# Altium schematic symbol library ON Semi Transient Voltage Suppressors (TVS).SchLib: 730 symbols (part 3 of 5) (continued)
## MMBZ33VALT1G
designator D?
40 W Peak Power Zener Transient Voltage Suppressor, Dual Common Anode Zeners for ESD Protection, 3-Pin SOT-23, Pb-Free, Tape and Reel; Manufacturer: On Semiconductor; PartNumber: MMBZ33VALT1G; Direction: Unidirectional; IR Max (uA): 0.05; PPK Max (W): 40; V(BR) Typ (V): 33; DatasheetVersion: Rev. 13; PackageVersion: Rev. AP, 11/2009; PackageReference: SOT-23-3-318-08; PackageDescription: 3-Pin Small Outline Transistor, Body 2.92 x 1.3 mm, Pitch 0.95 mm; Supplier 1: Digi-Key; Supplier Part Number 1: MMBZ33VALT1GOSTR-ND; Supplier 2: Digi-Key; Supplier Part Number 2: MMBZ33VALT1GOSCT-ND; Supplier 3: Digi-Key; Supplier Part Number 3: MMBZ33VALT1GOSDKR-ND; Supplier 4: Farnell; Supplier Part Number 4: 1431231; Supplier 5: Farnell; Supplier Part Number 5: 1431231RL; Supplier 6: Farnell; Supplier Part Number 6: 2317785; Supplier 7: Newark; Supplier Part Number 7: 85W2815; Supplier 8: Newark; Supplier Part Number 8: 98H0767; Supplier 9: Mouser; Supplier Part Number 9: 863-MMBZ33VALT1G; Packing: Tape and Reel; RoHS: Pb-Free; Mounting Technology: Surface Mount; ComponentLink1Description: Manufacturer URL; ComponentLink1URL: http://www.onsemi.com/; ComponentLink2Description: Datasheet; ComponentLink2URL: http://www.onsemi.com/pub_link/Collateral/MMBZ5V6ALT1-D.PDF; ComponentLink3Description: Package Specification; ComponentLink3URL: http://www.onsemi.cn/pub_link/Collateral/318-08.PDF
footprint ONSC-SOT-23-3-318-08_V (SOT23, 3-Leads, Body 2.92x1.3mm, Pitch 0.95mm)
pins: 1 K1, 2 K2, 3 A

## MMQA5V6T1G
designator U?
Quad Monolithic Common Anode, Transient Voltage Suppressor for ESD Protection, 6-Pin SC-74, Pb-Free, Tape and Reel; Manufacturer: On Semiconductor; PartNumber: MMQA5V6T1G; Direction: Unidirectional; IR Max (uA): 2; V(BR) Typ (V): 5.6; DatasheetVersion: Rev. 10; PackageVersion: Rev. N, 06/2012; PackageReference: SC-74-6-318F-05; PackageDescription: 6-Pin Small Outline Transistor, Body 3 x 1.5 mm, Pitch 0.95 mm; Supplier 1: Digi-Key; Supplier Part Number 1: MMQA5V6T1GOSTR-ND; Supplier 2: Digi-Key; Supplier Part Number 2: MMQA5V6T1GOSCT-ND; Supplier 3: Digi-Key; Supplier Part Number 3: MMQA5V6T1GOSDKR-ND; Supplier 4: Farnell; Supplier Part Number 4: 1459113RL; Supplier 5: Newark; Supplier Part Number 5: 98H0804; Supplier 6: Mouser; Supplier Part Number 6: 863-MMQA5V6T1G; Packing: Tape and Reel; RoHS: Pb-Free; Mounting Technology: Surface Mount; ComponentLink1Description: Manufacturer URL; ComponentLink1URL: http://www.onsemi.com/; ComponentLink2Description: Datasheet; ComponentLink2URL: http://www.onsemi.com/pub_link/Collateral/MMQA-D.PDF; ComponentLink3Description: Package Specification; ComponentLink3URL: http://www.onsemi.com/pub_link/Collateral/318F-05.PDF
footprint ONSC-SC-74-6-318F-05_V (SOT23, 6-Leads, Body 3x1.5mm, Pitch 0.95mm)
pins: 1 K1, 2 A1, 3 K2, 4 K3, 5 A2, 6 K4

## MMQA5V6T3G
designator U?
Quad Monolithic Common Anode, Transient Voltage Suppressor for ESD Protection, 6-Pin SC-74, Pb-Free, Tape and Reel; Manufacturer: On Semiconductor; PartNumber: MMQA5V6T3G; Direction: Unidirectional; IR Max (uA): 2; V(BR) Typ (V): 5.6; DatasheetVersion: Rev. 10; PackageVersion: Rev. N, 06/2012; PackageReference: SC-74-6-318F-05; PackageDescription: 6-Pin Small Outline Transistor, Body 3 x 1.5 mm, Pitch 0.95 mm; Supplier 1: Digi-Key; Supplier Part Number 1: MMQA5V6T3G-ND; Supplier 2: Mouser; Supplier Part Number 2: 863-MMQA5V6T3G; Packing: Tape and Reel; RoHS: Pb-Free; Mounting Technology: Surface Mount; ComponentLink1Description: Manufacturer URL; ComponentLink1URL: http://www.onsemi.com/; ComponentLink2Description: Datasheet; ComponentLink2URL: http://www.onsemi.com/pub_link/Collateral/MMQA-D.PDF; ComponentLink3Description: Package Specification; ComponentLink3URL: http://www.onsemi.com/pub_link/Collateral/318F-05.PDF
footprint ONSC-SC-74-6-318F-05_V (SOT23, 6-Leads, Body 3x1.5mm, Pitch 0.95mm)
pins: 1 K1, 2 A1, 3 K2, 4 K3, 5 A2, 6 K4

## MMQA6V2T1G
designator U?
Quad Monolithic Common Anode, Transient Voltage Suppressor for ESD Protection, 6-Pin SC-74, Pb-Free, Tape and Reel; Manufacturer: On Semiconductor; PartNumber: MMQA6V2T1G; Direction: Unidirectional; IR Max (uA): 0.7; V(BR) Typ (V): 6.2; DatasheetVersion: Rev. 10; PackageVersion: Rev. N, 06/2012; PackageReference: SC-74-6-318F-05; PackageDescription: 6-Pin Small Outline Transistor, Body 3 x 1.5 mm, Pitch 0.95 mm; Supplier 1: Digi-Key; Supplier Part Number 1: MMQA6V2T1GOSTR-ND; Supplier 2: Digi-Key; Supplier Part Number 2: MMQA6V2T1GOSCT-ND; Supplier 3: Digi-Key; Supplier Part Number 3: MMQA6V2T1GOSDKR-ND; Supplier 4: Newark; Supplier Part Number 4: 45J1567; Supplier 5: Mouser; Supplier Part Number 5: 863-MMQA6V2T1G; Packing: Tape and Reel; RoHS: Pb-Free; Mounting Technology: Surface Mount; ComponentLink1Description: Manufacturer URL; ComponentLink1URL: http://www.onsemi.com/; ComponentLink2Description: Datasheet; ComponentLink2URL: http://www.onsemi.com/pub_link/Collateral/MMQA-D.PDF; ComponentLink3Description: Package Specification; ComponentLink3URL: http://www.onsemi.com/pub_link/Collateral/318F-05.PDF
footprint ONSC-SC-74-6-318F-05_V (SOT23, 6-Leads, Body 3x1.5mm, Pitch 0.95mm)
pins: 1 K1, 2 A1, 3 K2, 4 K3, 5 A2, 6 K4

## MMQA6V2T3G
designator U?
Quad Monolithic Common Anode, Transient Voltage Suppressor for ESD Protection, 6-Pin SC-74, Pb-Free, Tape and Reel; Manufacturer: On Semiconductor; PartNumber: MMQA6V2T3G; Direction: Unidirectional; IR Max (uA): 0.7; V(BR) Typ (V): 6.2; DatasheetVersion: Rev. 10; PackageVersion: Rev. N, 06/2012; PackageReference: SC-74-6-318F-05; PackageDescription: 6-Pin Small Outline Transistor, Body 3 x 1.5 mm, Pitch 0.95 mm; Supplier 1: Digi-Key; Supplier Part Number 1: MMQA6V2T3G-ND; Supplier 2: Mouser; Supplier Part Number 2: 863-MMQA6V2T3G; Packing: Tape and Reel; RoHS: Pb-Free; Mounting Technology: Surface Mount; ComponentLink1Description: Manufacturer URL; ComponentLink1URL: http://www.onsemi.com/; ComponentLink2Description: Datasheet; ComponentLink2URL: http://www.onsemi.com/pub_link/Collateral/MMQA-D.PDF; ComponentLink3Description: Package Specification; ComponentLink3URL: http://www.onsemi.com/pub_link/Collateral/318F-05.PDF
footprint ONSC-SC-74-6-318F-05_V (SOT23, 6-Leads, Body 3x1.5mm, Pitch 0.95mm)
pins: 1 K1, 2 A1, 3 K2, 4 K3, 5 A2, 6 K4

## MMQA6V8T1G
designator U?
Quad Monolithic Common Anode, Transient Voltage Suppressor for ESD Protection, 6-Pin SC-74, Pb-Free, Tape and Reel; Manufacturer: On Semiconductor; PartNumber: MMQA6V8T1G; Direction: Unidirectional; IR Max (uA): 0.5; V(BR) Typ (V): 6.8; DatasheetVersion: Rev. 10; PackageVersion: Rev. N, 06/2012; PackageReference: SC-74-6-318F-05; PackageDescription: 6-Pin Small Outline Transistor, Body 3 x 1.5 mm, Pitch 0.95 mm; Supplier 1: Digi-Key; Supplier Part Number 1: MMQA6V8T1GOSTR-ND; Supplier 2: Digi-Key; Supplier Part Number 2: MMQA6V8T1GOSCT-ND; Supplier 3: Digi-Key; Supplier Part Number 3: MMQA6V8T1GOSDKR-ND; Supplier 4: Mouser; Supplier Part Number 4: 863-MMQA6V8T1G; Packing: Tape and Reel; RoHS: Pb-Free; Mounting Technology: Surface Mount; ComponentLink1Description: Manufacturer URL; ComponentLink1URL: http://www.onsemi.com/; ComponentLink2Description: Datasheet; ComponentLink2URL: http://www.onsemi.com/pub_link/Collateral/MMQA-D.PDF; ComponentLink3Description: Package Specification; ComponentLink3URL: http://www.onsemi.com/pub_link/Collateral/318F-05.PDF
footprint ONSC-SC-74-6-318F-05_V (SOT23, 6-Leads, Body 3x1.5mm, Pitch 0.95mm)
pins: 1 K1, 2 A1, 3 K2, 4 K3, 5 A2, 6 K4

## MMQA12VT1G
designator U?
Quad Monolithic Common Anode, Transient Voltage Suppressor for ESD Protection, 6-Pin SC-74, Pb-Free, Tape and Reel; Manufacturer: On Semiconductor; PartNumber: MMQA12VT1G; Direction: Unidirectional; IR Max (uA): 0.075; V(BR) Typ (V): 12; DatasheetVersion: Rev. 10; PackageVersion: Rev. N, 06/2012; PackageReference: SC-74-6-318F-05; PackageDescription: 6-Pin Small Outline Transistor, Body 3 x 1.5 mm, Pitch 0.95 mm; Supplier 1: Digi-Key; Supplier Part Number 1: MMQA12VT1GOSTR-ND; Supplier 2: Digi-Key; Supplier Part Number 2: MMQA12VT1GOSCT-ND; Supplier 3: Digi-Key; Supplier Part Number 3: MMQA12VT1GOSDKR-ND; Supplier 4: Farnell; Supplier Part Number 4: 1899523; Supplier 5: Newark; Supplier Part Number 5: 09R9473; Supplier 6: Mouser; Supplier Part Number 6: 863-MMQA12VT1G; Packing: Tape and Reel; RoHS: Pb-Free; Mounting Technology: Surface Mount; ComponentLink1Description: Manufacturer URL; ComponentLink1URL: http://www.onsemi.com/; ComponentLink2Description: Datasheet; ComponentLink2URL: http://www.onsemi.com/pub_link/Collateral/MMQA-D.PDF; ComponentLink3Description: Package Specification; ComponentLink3URL: http://www.onsemi.com/pub_link/Collateral/318F-05.PDF
footprint ONSC-SC-74-6-318F-05_V (SOT23, 6-Leads, Body 3x1.5mm, Pitch 0.95mm)
pins: 1 K1, 2 A1, 3 K2, 4 K3, 5 A2, 6 K4

## MMQA15VT1G
designator U?
Quad Monolithic Common Anode, Transient Voltage Suppressor for ESD Protection, 6-Pin SC-74, Pb-Free, Tape and Reel; Manufacturer: On Semiconductor; PartNumber: MMQA15VT1G; Direction: Unidirectional; IR Max (uA): 0.075; V(BR) Typ (V): 15; DatasheetVersion: Rev. 10; PackageVersion: Rev. N, 06/2012; PackageReference: SC-74-6-318F-05; PackageDescription: 6-Pin Small Outline Transistor, Body 3 x 1.5 mm, Pitch 0.95 mm; Supplier 1: Digi-Key; Supplier Part Number 1: MMQA15VT1G-ND; Supplier 2: Mouser; Supplier Part Number 2: 863-MMQA15VT1G; Packing: Tape and Reel; RoHS: Pb-Free; Mounting Technology: Surface Mount; ComponentLink1Description: Manufacturer URL; ComponentLink1URL: http://www.onsemi.com/; ComponentLink2Description: Datasheet; ComponentLink2URL: http://www.onsemi.com/pub_link/Collateral/MMQA-D.PDF; ComponentLink3Description: Package Specification; ComponentLink3URL: http://www.onsemi.com/pub_link/Collateral/318F-05.PDF
footprint ONSC-SC-74-6-318F-05_V (SOT23, 6-Leads, Body 3x1.5mm, Pitch 0.95mm)
pins: 1 K1, 2 A1, 3 K2, 4 K3, 5 A2, 6 K4

## MMQA18VT1G
designator U?
Quad Monolithic Common Anode, Transient Voltage Suppressor for ESD Protection, 6-Pin SC-74, Pb-Free, Tape and Reel; Manufacturer: On Semiconductor; PartNumber: MMQA18VT1G; Direction: Unidirectional; IR Max (uA): 0.075; V(BR) Typ (V): 18; DatasheetVersion: Rev. 10; PackageVersion: Rev. N, 06/2012; PackageReference: SC-74-6-318F-05; PackageDescription: 6-Pin Small Outline Transistor, Body 3 x 1.5 mm, Pitch 0.95 mm; Supplier 1: Digi-Key; Supplier Part Number 1: MMQA18VT1GOSTR-ND; Supplier 2: Digi-Key; Supplier Part Number 2: MMQA18VT1GOSCT-ND; Supplier 3: Digi-Key; Supplier Part Number 3: MMQA18VT1GOSDKR-ND; Supplier 4: Newark; Supplier Part Number 4: 45J1564; Supplier 5: Mouser; Supplier Part Number 5: 863-MMQA18VT1G; Packing: Tape and Reel; RoHS: Pb-Free; Mounting Technology: Surface Mount; ComponentLink1Description: Manufacturer URL; ComponentLink1URL: http://www.onsemi.com/; ComponentLink2Description: Datasheet; ComponentLink2URL: http://www.onsemi.com/pub_link/Collateral/MMQA-D.PDF; ComponentLink3Description: Package Specification; ComponentLink3URL: http://www.onsemi.com/pub_link/Collateral/318F-05.PDF
footprint ONSC-SC-74-6-318F-05_V (SOT23, 6-Leads, Body 3x1.5mm, Pitch 0.95mm)
pins: 1 K1, 2 A1, 3 K2, 4 K3, 5 A2, 6 K4

## MMQA20VT1G
designator U?
Quad Monolithic Common Anode, Transient Voltage Suppressor for ESD Protection, 6-Pin SC-74, Pb-Free, Tape and Reel; Manufacturer: On Semiconductor; PartNumber: MMQA20VT1G; Direction: Unidirectional; IR Max (uA): 0.075; V(BR) Typ (V): 20; DatasheetVersion: Rev. 10; PackageVersion: Rev. N, 06/2012; PackageReference: SC-74-6-318F-05; PackageDescription: 6-Pin Small Outline Transistor, Body 3 x 1.5 mm, Pitch 0.95 mm; Supplier 1: Digi-Key; Supplier Part Number 1: MMQA20VT1GOSTR-ND; Supplier 2: Digi-Key; Supplier Part Number 2: MMQA20VT1GOSCT-ND; Supplier 3: Digi-Key; Supplier Part Number 3: MMQA20VT1GOSDKR-ND; Supplier 4: Mouser; Supplier Part Number 4: 863-MMQA20VT1G; Packing: Tape and Reel; RoHS: Pb-Free; Mounting Technology: Surface Mount; ComponentLink1Description: Manufacturer URL; ComponentLink1URL: http://www.onsemi.com/; ComponentLink2Description: Datasheet; ComponentLink2URL: http://www.onsemi.com/pub_link/Collateral/MMQA-D.PDF; ComponentLink3Description: Package Specification; ComponentLink3URL: http://www.onsemi.com/pub_link/Collateral/318F-05.PDF
footprint ONSC-SC-74-6-318F-05_V (SOT23, 6-Leads, Body 3x1.5mm, Pitch 0.95mm)
pins: 1 K1, 2 A1, 3 K2, 4 K3, 5 A2, 6 K4

## MMQA20VT3G
designator U?
Quad Monolithic Common Anode, Transient Voltage Suppressor for ESD Protection, 6-Pin SC-74, Pb-Free, Tape and Reel; Manufacturer: On Semiconductor; PartNumber: MMQA20VT3G; Direction: Unidirectional; IR Max (uA): 0.075; V(BR) Typ (V): 20; DatasheetVersion: Rev. 10; PackageVersion: Rev. N, 06/2012; PackageReference: SC-74-6-318F-05; PackageDescription: 6-Pin Small Outline Transistor, Body 3 x 1.5 mm, Pitch 0.95 mm; Supplier 1: Digi-Key; Supplier Part Number 1: MMQA20VT3G-ND; Supplier 2: Mouser; Supplier Part Number 2: 863-MMQA20VT3G; Packing: Tape and Reel; RoHS: Pb-Free; Mounting Technology: Surface Mount; ComponentLink1Description: Manufacturer URL; ComponentLink1URL: http://www.onsemi.com/; ComponentLink2Description: Datasheet; ComponentLink2URL: http://www.onsemi.com/pub_link/Collateral/MMQA-D.PDF; ComponentLink3Description: Package Specification; ComponentLink3URL: http://www.onsemi.com/pub_link/Collateral/318F-05.PDF
footprint ONSC-SC-74-6-318F-05_V (SOT23, 6-Leads, Body 3x1.5mm, Pitch 0.95mm)
pins: 1 K1, 2 A1, 3 K2, 4 K3, 5 A2, 6 K4

## MMQA22VT1G
designator U?
Quad Monolithic Common Anode, Transient Voltage Suppressor for ESD Protection, 6-Pin SC-74, Pb-Free, Tape and Reel; Manufacturer: On Semiconductor; PartNumber: MMQA22VT1G; Direction: Unidirectional; IR Max (uA): 0.075; V(BR) Typ (V): 22; DatasheetVersion: Rev. 10; PackageVersion: Rev. N, 06/2012; PackageReference: SC-74-6-318F-05; PackageDescription: 6-Pin Small Outline Transistor, Body 3 x 1.5 mm, Pitch 0.95 mm; Supplier 1: Digi-Key; Supplier Part Number 1: MMQA22VT1G-ND; Supplier 2: Mouser; Supplier Part Number 2: 863-MMQA22VT1G; Packing: Tape and Reel; RoHS: Pb-Free; Mounting Technology: Surface Mount; ComponentLink1Description: Manufacturer URL; ComponentLink1URL: http://www.onsemi.com/; ComponentLink2Description: Datasheet; ComponentLink2URL: http://www.onsemi.com/pub_link/Collateral/MMQA-D.PDF; ComponentLink3Description: Package Specification; ComponentLink3URL: http://www.onsemi.com/pub_link/Collateral/318F-05.PDF
footprint ONSC-SC-74-6-318F-05_V (SOT23, 6-Leads, Body 3x1.5mm, Pitch 0.95mm)
pins: 1 K1, 2 A1, 3 K2, 4 K3, 5 A2, 6 K4

## MMQA24VT
designator U?
Quad Monolithic Common Anode, Transient Voltage Suppressor for ESD Protection, 6-Pin SC-74, Tape and Reel; Manufacturer: On Semiconductor; PartNumber: MMQA24VT; Direction: Unidirectional; IR Max (uA): 0.075; V(BR) Typ (V): 24; DatasheetVersion: Rev. 10; PackageVersion: Rev. N, 06/2012; PackageReference: SC-74-6-318F-05; PackageDescription: 6-Pin Small Outline Transistor, Body 3 x 1.5 mm, Pitch 0.95 mm; Packing: Tape and Reel; Mounting Technology: Surface Mount; ComponentLink1Description: Manufacturer URL; ComponentLink1URL: http://www.onsemi.com/; ComponentLink2Description: Datasheet; ComponentLink2URL: http://www.onsemi.com/pub_link/Collateral/MMQA-D.PDF; ComponentLink3Description: Package Specification; ComponentLink3URL: http://www.onsemi.com/pub_link/Collateral/318F-05.PDF
footprint ONSC-SC-74-6-318F-05_V (SOT23, 6-Leads, Body 3x1.5mm, Pitch 0.95mm)
pins: 1 K1, 2 A1, 3 K2, 4 K3, 5 A2, 6 K4

## MMQA24VT1G
designator U?
Quad Monolithic Common Anode, Transient Voltage Suppressor for ESD Protection, 6-Pin SC-74, Pb-Free, Tape and Reel; Manufacturer: On Semiconductor; PartNumber: MMQA24VT1G; Direction: Unidirectional; IR Max (uA): 0.075; V(BR) Typ (V): 24; DatasheetVersion: Rev. 10; PackageVersion: Rev. N, 06/2012; PackageReference: SC-74-6-318F-05; PackageDescription: 6-Pin Small Outline Transistor, Body 3 x 1.5 mm, Pitch 0.95 mm; Supplier 1: Digi-Key; Supplier Part Number 1: MMQA24VT1GOSTR-ND; Supplier 2: Digi-Key; Supplier Part Number 2: MMQA24VT1GOSCT-ND; Supplier 3: Newark; Supplier Part Number 3: 26K4559; Supplier 4: Mouser; Supplier Part Number 4: 863-MMQA24VT1G; Packing: Tape and Reel; RoHS: Pb-Free; Mounting Technology: Surface Mount; ComponentLink1Description: Manufacturer URL; ComponentLink1URL: http://www.onsemi.com/; ComponentLink2Description: Datasheet; ComponentLink2URL: http://www.onsemi.com/pub_link/Collateral/MMQA-D.PDF; ComponentLink3Description: Package Specification; ComponentLink3URL: http://www.onsemi.com/pub_link/Collateral/318F-05.PDF
footprint ONSC-SC-74-6-318F-05_V (SOT23, 6-Leads, Body 3x1.5mm, Pitch 0.95mm)
pins: 1 K1, 2 A1, 3 K2, 4 K3, 5 A2, 6 K4

## MMQA27VT1G
designator U?
Quad Monolithic Common Anode, Transient Voltage Suppressor for ESD Protection, 6-Pin SC-74, Pb-Free, Tape and Reel; Manufacturer: On Semiconductor; PartNumber: MMQA27VT1G; Direction: Unidirectional; IR Max (uA): 0.075; V(BR) Typ (V): 27; DatasheetVersion: Rev. 10; PackageVersion: Rev. N, 06/2012; PackageReference: SC-74-6-318F-05; PackageDescription: 6-Pin Small Outline Transistor, Body 3 x 1.5 mm, Pitch 0.95 mm; Supplier 1: Digi-Key; Supplier Part Number 1: MMQA27VT1GOSTR-ND; Supplier 2: Digi-Key; Supplier Part Number 2: MMQA27VT1GOSCT-ND; Supplier 3: Digi-Key; Supplier Part Number 3: MMQA27VT1GOSDKR-ND; Supplier 4: Newark; Supplier Part Number 4: 26K4560; Supplier 5: Mouser; Supplier Part Number 5: 863-MMQA27VT1G; Packing: Tape and Reel; RoHS: Pb-Free; Mounting Technology: Surface Mount; ComponentLink1Description: Manufacturer URL; ComponentLink1URL: http://www.onsemi.com/; ComponentLink2Description: Datasheet; ComponentLink2URL: http://www.onsemi.com/pub_link/Collateral/MMQA-D.PDF; ComponentLink3Description: Package Specification; ComponentLink3URL: http://www.onsemi.com/pub_link/Collateral/318F-05.PDF
footprint ONSC-SC-74-6-318F-05_V (SOT23, 6-Leads, Body 3x1.5mm, Pitch 0.95mm)
pins: 1 K1, 2 A1, 3 K2, 4 K3, 5 A2, 6 K4

## MMQA33VT1G
designator U?
Quad Monolithic Common Anode, Transient Voltage Suppressor for ESD Protection, 6-Pin SC-74, Pb-Free, Tape and Reel; Manufacturer: On Semiconductor; PartNumber: MMQA33VT1G; Direction: Unidirectional; IR Max (uA): 0.075; V(BR) Typ (V): 33; DatasheetVersion: Rev. 10; PackageVersion: Rev. N, 06/2012; PackageReference: SC-74-6-318F-05; PackageDescription: 6-Pin Small Outline Transistor, Body 3 x 1.5 mm, Pitch 0.95 mm; Supplier 1: Digi-Key; Supplier Part Number 1: MMQA33VT1GOSTR-ND; Supplier 2: Digi-Key; Supplier Part Number 2: MMQA33VT1GOSCT-ND; Supplier 3: Digi-Key; Supplier Part Number 3: MMQA33VT1GOSDKR-ND; Supplier 4: Farnell; Supplier Part Number 4: 2317786; Supplier 5: Farnell; Supplier Part Number 5: 1886877; Supplier 6: Newark; Supplier Part Number 6: 09R9476; Supplier 7: Newark; Supplier Part Number 7: 42K1365; Supplier 8: Mouser; Supplier Part Number 8: 863-MMQA33VT1G; Packing: Tape and Reel; RoHS: Pb-Free; Mounting Technology: Surface Mount; ComponentLink1Description: Manufacturer URL; ComponentLink1URL: http://www.onsemi.com/; ComponentLink2Description: Datasheet; ComponentLink2URL: http://www.onsemi.com/pub_link/Collateral/MMQA-D.PDF; ComponentLink3Description: Package Specification; ComponentLink3URL: http://www.onsemi.com/pub_link/Collateral/318F-05.PDF
footprint ONSC-SC-74-6-318F-05_V (SOT23, 6-Leads, Body 3x1.5mm, Pitch 0.95mm)
pins: 1 K1, 2 A1, 3 K2, 4 K3, 5 A2, 6 K4

## NS6A5.0AFT3G
designator D?
600 W Peak Power Zener Transient Voltage Suppressor, Unidirectional, 2-Pin SMA-FL, Pb-Free, Tape and Reel; Manufacturer: On Semiconductor; PartNumber: NS6A5.0AFT3G; IR Max (uA): 800; PPK Max (W): 600; V(BR) Typ (V): 6.7; DatasheetVersion: Rev. 0; PackageVersion: Rev. O, 03/2011; PackageReference: SMA-FL-2-403AA-01; PackageDescription: 2-Pin Small Molded Package, Body 2.6 x 4.3 mm; Supplier 1: Newark; Supplier Part Number 1: 72W2317; Supplier 2: Mouser; Supplier Part Number 2: 863-NS6A5.0AFT3G; Direction: Unidirectional; Packing: Tape and Reel; RoHS: Pb-Free; Mounting Technology: Surface Mount; ComponentLink1Description: Manufacturer URL; ComponentLink1URL: http://www.onsemi.com/; ComponentLink2Description: Datasheet; ComponentLink2URL: http://www.onsemi.com/pub_link/Collateral/NS6A5.0AF-D.PDF; ComponentLink3Description: Package Specification; ComponentLink3URL: http://www.onsemi.com/pub_link/Collateral/403AA.PDF
footprint ONSC-SMA-FL-2-403AA-01_V (Molded, 2-Leads, Body 4.6x2.8mm)
pins: 1 K, 2 A

## NS6A5.0AT3G
designator D?
600 W Peak Power Zener Transient Voltage Suppressor, Unidirectional, 2-Pin SMA, Pb-Free, Tape and Reel; Manufacturer: On Semiconductor; PartNumber: NS6A5.0AT3G; IR Max (uA): 800; PPK Max (W): 600; V(BR) Typ (V): 6.7; DatasheetVersion: Rev. 1; PackageVersion: Rev. F, 11/2008; PackageReference: SMA-2-403D-02_F; PackageDescription: 2-Pin Small Molded Package, J-Bend Lead, Body 2.605 x 4.315 mm; Supplier 1: Digi-Key; Supplier Part Number 1: NS6A5.0AT3G-ND; Supplier 2: Newark; Supplier Part Number 2: 46P8329; Supplier 3: Mouser; Supplier Part Number 3: 863-NS6A5.0AT3G; Direction: Unidirectional; Packing: Tape and Reel; RoHS: Pb-Free; Mounting Technology: Surface Mount; ComponentLink1Description: Manufacturer URL; ComponentLink1URL: http://www.onsemi.com/; ComponentLink2Description: Datasheet; ComponentLink2URL: http://www.onsemi.com/pub_link/Collateral/NS6A5.0A-D.PDF; ComponentLink3Description: Package Specification; ComponentLink3URL: http://www.onsemi.com/pub_link/Collateral/1SMA5913BT3-D.PDF
footprint ONSC-SMA-2-403D-02_F_V (Molded, 2-Leads, Body 4.32x2.6mm)
pins: 1 K, 2 A

## NS6A12AFT3G
designator D?
600 W Peak Power Zener Transient Voltage Suppressor, Unidirectional, 2-Pin SMA-FL, Pb-Free, Tape and Reel; Manufacturer: On Semiconductor; PartNumber: NS6A12AFT3G; IR Max (uA): 0.5; PPK Max (W): 600; V(BR) Typ (V): 14; DatasheetVersion: Rev. 0; PackageVersion: Rev. O, 03/2011; PackageReference: SMA-FL-2-403AA-01; PackageDescription: 2-Pin Small Molded Package, Body 2.6 x 4.3 mm; Supplier 1: Newark; Supplier Part Number 1: 72W2315; Supplier 2: Mouser; Supplier Part Number 2: 863-NS6A12AFT3G; Direction: Unidirectional; Packing: Tape and Reel; RoHS: Pb-Free; Mounting Technology: Surface Mount; ComponentLink1Description: Manufacturer URL; ComponentLink1URL: http://www.onsemi.com/; ComponentLink2Description: Datasheet; ComponentLink2URL: http://www.onsemi.com/pub_link/Collateral/NS6A5.0AF-D.PDF; ComponentLink3Description: Package Specification; ComponentLink3URL: http://www.onsemi.com/pub_link/Collateral/403AA.PDF
footprint ONSC-SMA-FL-2-403AA-01_V (Molded, 2-Leads, Body 4.6x2.8mm)
pins: 1 K, 2 A

## NS6A13AFT3G
designator D?
600 W Peak Power Zener Transient Voltage Suppressor, Unidirectional, 2-Pin SMA-FL, Pb-Free, Tape and Reel; Manufacturer: On Semiconductor; PartNumber: NS6A13AFT3G; IR Max (uA): 5; PPK Max (W): 600; V(BR) Typ (V): 15.15; DatasheetVersion: Rev. 0; PackageVersion: Rev. O, 03/2011; PackageReference: SMA-FL-2-403AA-01; PackageDescription: 2-Pin Small Molded Package, Body 2.6 x 4.3 mm; Supplier 1: Newark; Supplier Part Number 1: 72W2316; Supplier 2: Mouser; Supplier Part Number 2: 863-NS6A13AFT3G; Direction: Unidirectional; Packing: Tape and Reel; RoHS: Pb-Free; Mounting Technology: Surface Mount; ComponentLink1Description: Manufacturer URL; ComponentLink1URL: http://www.onsemi.com/; ComponentLink2Description: Datasheet; ComponentLink2URL: http://www.onsemi.com/pub_link/Collateral/NS6A5.0AF-D.PDF; ComponentLink3Description: Package Specification; ComponentLink3URL: http://www.onsemi.com/pub_link/Collateral/403AA.PDF
footprint ONSC-SMA-FL-2-403AA-01_V (Molded, 2-Leads, Body 4.6x2.8mm)
pins: 1 K, 2 A

## NS6A13AT3G
designator D?
600 W Peak Power Zener Transient Voltage Suppressor, Unidirectional, 2-Pin SMA, Pb-Free, Tape and Reel; Manufacturer: On Semiconductor; PartNumber: NS6A13AT3G; IR Max (uA): 5; PPK Max (W): 600; V(BR) Typ (V): 15.15; DatasheetVersion: Rev. 1; PackageVersion: Rev. F, 11/2008; PackageReference: SMA-2-403D-02_F; PackageDescription: 2-Pin Small Molded Package, J-Bend Lead, Body 2.605 x 4.315 mm; Supplier 1: Digi-Key; Supplier Part Number 1: NS6A13AT3G-ND; Supplier 2: Mouser; Supplier Part Number 2: 863-NS6A13AT3G; Direction: Unidirectional; Packing: Tape and Reel; RoHS: Pb-Free; Mounting Technology: Surface Mount; ComponentLink1Description: Manufacturer URL; ComponentLink1URL: http://www.onsemi.com/; ComponentLink2Description: Datasheet; ComponentLink2URL: http://www.onsemi.com/pub_link/Collateral/NS6A13A-D.PDF; ComponentLink3Description: Package Specification; ComponentLink3URL: http://www.onsemi.com/pub_link/Collateral/1SMA5913BT3-D.PDF
footprint ONSC-SMA-2-403D-02_F_V (Molded, 2-Leads, Body 4.32x2.6mm)
pins: 1 K, 2 A

## NSA5.0AFT3G
designator D?
400 W Peak Power Zener Transient Voltage Suppressor, Unidirectional, 2-Pin SMA, Pb-Free, Tape and Reel; Manufacturer: On Semiconductor; PartNumber: NSA5.0AFT3G; IR Max (uA): 400; V(BR) Typ (V): 6.7; DatasheetVersion: Rev. 0; PackageVersion: Rev. O, 03/2011; PackageReference: SMA-FL-2-403AA-01; PackageDescription: 2-Pin Small Molded Package, Body 2.6 x 4.3 mm; Supplier 1: Newark; Supplier Part Number 1: 76T6689; Supplier 2: Mouser; Supplier Part Number 2: 863-NSA5.0AFT3G; Direction: Unidirectional; Packing: Tape and Reel; PPK Max (W): 400; RoHS: Pb-Free; Mounting Technology: Surface Mount; ComponentLink1Description: Manufacturer URL; ComponentLink1URL: http://www.onsemi.com/; ComponentLink2Description: Datasheet; ComponentLink2URL: http://www.onsemi.com/pub_link/Collateral/NSA5.0AF-D.PDF; ComponentLink3Description: Package Specification; ComponentLink3URL: http://www.onsemi.com/pub_link/Collateral/403AA.PDF
footprint ONSC-SMA-FL-2-403AA-01_V (Molded, 2-Leads, Body 4.6x2.8mm)
pins: 1 K, 2 A

## NSA5.0AT3G
designator D?
400 W Peak Power Zener Transient Voltage Suppressor, Unidirectional, 2-Pin SMA, Pb-Free, Tape and Reel; Manufacturer: On Semiconductor; PartNumber: NSA5.0AT3G; IR Max (uA): 400; V(BR) Typ (V): 6.7; DatasheetVersion: Rev. 1; PackageVersion: Rev. G, 07/2012; PackageReference: SMA-2-403D-02; PackageDescription: 2-Pin Small Molded Package, J-Bend Lead, Body 2.605 x 4.315 mm; Supplier 1: Digi-Key; Supplier Part Number 1: NSA5.0AT3G-ND; Supplier 2: Newark; Supplier Part Number 2: 95M6970; Supplier 3: Mouser; Supplier Part Number 3: 863-NSA5.0AT3G; Direction: Unidirectional; Packing: Tape and Reel; PPK Max (W): 400; RoHS: Pb-Free; Mounting Technology: Surface Mount; ComponentLink1Description: Manufacturer URL; ComponentLink1URL: http://www.onsemi.com/; ComponentLink2Description: Datasheet; ComponentLink2URL: http://www.onsemi.com/pub_link/Collateral/NSA5.0A-D.PDF; ComponentLink3Description: Package Specification; ComponentLink3URL: http://www.onsemi.com/pub_link/Collateral/403D-02.PDF
footprint ONSC-SMA-2-403D-02_V (Molded, 2-Leads, Body 4.57x2.92mm)
pins: 1 K, 2 A

## NSB12ANT3G
designator D?
600 W Peak Power Zener Transient Voltage Suppressor, Unidirectional, 2-Pin SMB, Pb-Free, Tape and Reel; Manufacturer: On Semiconductor; PartNumber: NSB12ANT3G; IR Max (uA): 5; PPK Max (W): 600; V(BR) Typ (V): 13.75; DatasheetVersion: Rev. F; PackageVersion: Rev. F, 11/2005; PackageReference: SMB-2-403A-03_F; PackageDescription: 2-Pin Small Molded Package, J-Bend Lead, Body 4.33 x 3.625 mm; Supplier 1: Digi-Key; Supplier Part Number 1: NSB12ANT3G-ND; Supplier 2: Newark; Supplier Part Number 2: 95M6971; Supplier 3: Mouser; Supplier Part Number 3: 863-NSB12ANT3G; Direction: Unidirectional; Packing: Tape and Reel; RoHS: Pb-Free; Mounting Technology: Surface Mount; ComponentLink1Description: Manufacturer URL; ComponentLink1URL: http://www.onsemi.com/; ComponentLink2Description: Datasheet; ComponentLink2URL: http://www.onsemi.com/pub_link/Collateral/NSB12A-D.PDF; ComponentLink3Description: Package Specification; ComponentLink3URL: http://www.onsemi.com/pub_link/Collateral/NSB12A-D.PDF
footprint ONSC-SMB-2-403A-03_F_V (SOJ, 2-Leads, Body 4.6x3.95mm)
pins: 1 K, 2 A

## NZL5V6ATT1
designator D?
Dual Common Anode Zener for ESD Protection, 3-Pin SC-75, Tape and Reel; Manufacturer: On Semiconductor; PartNumber: NZL5V6ATT1; Direction: Unidirectional; IR Max (uA): 1; V(BR) Typ (V): 5.6; DatasheetVersion: Rev. 3; PackageVersion: Rev. F, 07/2005; PackageReference: SC-75-3-463-01; PackageDescription: 3-Pin Small Outline Transistor, Body 1.6 x 0.8 mm, Pitch 0.5 mm; Supplier 1: Digi-Key; Supplier Part Number 1: NZL5V6ATT1OS-ND; Packing: Tape and Reel; Mounting Technology: Surface Mount; ComponentLink1Description: Manufacturer URL; ComponentLink1URL: http://www.onsemi.com/; ComponentLink2Description: Datasheet; ComponentLink2URL: http://www.onsemi.com/pub_link/Collateral/NZL5V6ATT1-D.PDF; ComponentLink3Description: Package Specification; ComponentLink3URL: http://www.onsemi.com/pub_link/Collateral/463-01.PDF
footprint ONSC-SC-75-3-463-01_V (SOT23, 3-Leads, Body 1.6x0.8mm, Pitch 0.5mm)
pins: 1 K1, 2 K2, 3 A

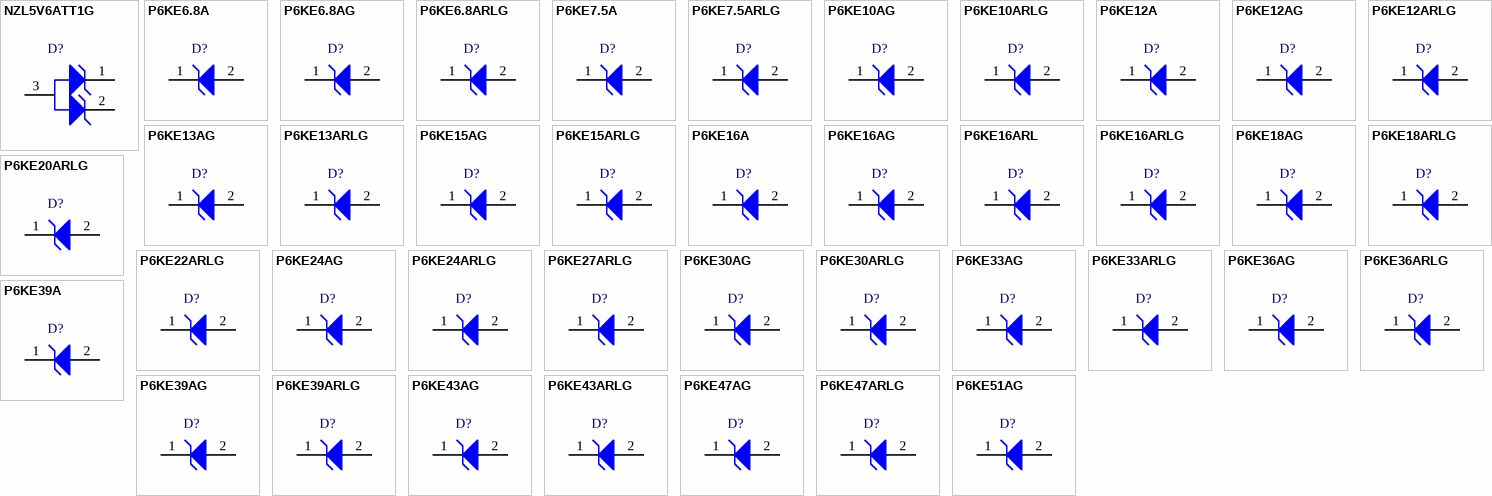
[diagram p10: symbols NZL5V6ATT1G to P6KE51AG]

## NZL5V6ATT1G
designator D?
Dual Common Anode Zener for ESD Protection, 3-Pin SC-75, Pb-Free, Tape and Reel; Manufacturer: On Semiconductor; PartNumber: NZL5V6ATT1G; Direction: Unidirectional; IR Max (uA): 1; V(BR) Typ (V): 5.6; DatasheetVersion: Rev. 3; PackageVersion: Rev. F, 07/2005; PackageReference: SC-75-3-463-01; PackageDescription: 3-Pin Small Outline Transistor, Body 1.6 x 0.8 mm, Pitch 0.5 mm; Supplier 1: Digi-Key; Supplier Part Number 1: NZL5V6ATT1GOSTR-ND; Supplier 2: Digi-Key; Supplier Part Number 2: NZL5V6ATT1GOSCT-ND; Supplier 3: Mouser; Supplier Part Number 3: 863-NZL5V6ATT1G; Packing: Tape and Reel; RoHS: Pb-Free; Mounting Technology: Surface Mount; ComponentLink1Description: Manufacturer URL; ComponentLink1URL: http://www.onsemi.com/; ComponentLink2Description: Datasheet; ComponentLink2URL: http://www.onsemi.com/pub_link/Collateral/NZL5V6ATT1-D.PDF; ComponentLink3Description: Package Specification; ComponentLink3URL: http://www.onsemi.com/pub_link/Collateral/463-01.PDF
footprint ONSC-SC-75-3-463-01_V (SOT23, 3-Leads, Body 1.6x0.8mm, Pitch 0.5mm)
pins: 1 K1, 2 K2, 3 A

## P6KE6.8A
designator D?
600 W Peak Power Transient Voltage Suppressor, 2-Pin Surmetic(TM) 40, Bulk Box; Manufacturer: On Semiconductor; PartNumber: P6KE6.8A; Direction: Unidirectional; IR Max (uA): 1000; PPK Max (W): 600; V(BR) Typ (V): 6.8; DatasheetVersion: Rev. 10; PackageVersion: Rev. O, 09/2005; PackageReference: SURMETIC40-2-017AA-01; PackageDescription: 2-Pin, Axial Lead, Diameter 3.49 mm; Supplier 1: Digi-Key; Supplier Part Number 1: P6KE6.8AOS-ND; Packing: Bulk Box; Mounting Technology: Through Hole; ComponentLink1Description: Manufacturer URL; ComponentLink1URL: http://www.onsemi.com/; ComponentLink2Description: Datasheet; ComponentLink2URL: http://www.onsemi.com/pub_link/Collateral/P6KE6.8A-D.PDF; ComponentLink3Description: Package Specification; ComponentLink3URL: http://www.onsemi.cn/pub_link/Collateral/017AA.PDF
footprint ONSC-SURMETIC40-2-017AA-01 (AXIAL, 2-Leads, Diameter 3.49mm)
pins: 1 K, 2 A

## P6KE6.8AG
designator D?
600 W Peak Power Transient Voltage Suppressor, 2-Pin Surmetic(TM) 40, Pb-Free, Bulk Box; Manufacturer: On Semiconductor; PartNumber: P6KE6.8AG; Direction: Unidirectional; IR Max (uA): 1000; PPK Max (W): 600; V(BR) Typ (V): 6.8; DatasheetVersion: Rev. 10; PackageVersion: Rev. O, 09/2005; PackageReference: SURMETIC40-2-017AA-01; PackageDescription: 2-Pin, Axial Lead, Diameter 3.49 mm; Supplier 1: Digi-Key; Supplier Part Number 1: P6KE6.8AGOS-ND; Supplier 2: Farnell; Supplier Part Number 2: 1147733; Supplier 3: Newark; Supplier Part Number 3: 42K2536; Supplier 4: Mouser; Supplier Part Number 4: 863-P6KE6.8AG; Packing: Bulk Box; RoHS: Pb-Free; Mounting Technology: Through Hole; ComponentLink1Description: Manufacturer URL; ComponentLink1URL: http://www.onsemi.com/; ComponentLink2Description: Datasheet; ComponentLink2URL: http://www.onsemi.com/pub_link/Collateral/P6KE6.8A-D.PDF; ComponentLink3Description: Package Specification; ComponentLink3URL: http://www.onsemi.cn/pub_link/Collateral/017AA.PDF
footprint ONSC-SURMETIC40-2-017AA-01 (AXIAL, 2-Leads, Diameter 3.49mm)
pins: 1 K, 2 A

## P6KE6.8ARLG
designator D?
600 W Peak Power Transient Voltage Suppressor, 2-Pin Surmetic(TM) 40, Pb-Free, Tape and Reel; Manufacturer: On Semiconductor; PartNumber: P6KE6.8ARLG; Direction: Unidirectional; IR Max (uA): 1000; PPK Max (W): 600; V(BR) Typ (V): 6.8; DatasheetVersion: Rev. 10; PackageVersion: Rev. O, 09/2005; PackageReference: SURMETIC40-2-017AA-01; PackageDescription: 2-Pin, Axial Lead, Diameter 3.49 mm; Supplier 1: Digi-Key; Supplier Part Number 1: P6KE6.8ARLGOSTR-ND; Supplier 2: Digi-Key; Supplier Part Number 2: P6KE6.8ARLGOSCT-ND; Supplier 3: Farnell; Supplier Part Number 3: 1887112; Supplier 4: Newark; Supplier Part Number 4: 09R9689; Supplier 5: Mouser; Supplier Part Number 5: 863-P6KE6.8ARLG; Packing: Tape and Reel; RoHS: Pb-Free; Mounting Technology: Through Hole; ComponentLink1Description: Manufacturer URL; ComponentLink1URL: http://www.onsemi.com/; ComponentLink2Description: Datasheet; ComponentLink2URL: http://www.onsemi.com/pub_link/Collateral/P6KE6.8A-D.PDF; ComponentLink3Description: Package Specification; ComponentLink3URL: http://www.onsemi.cn/pub_link/Collateral/017AA.PDF
footprint ONSC-SURMETIC40-2-017AA-01 (AXIAL, 2-Leads, Diameter 3.49mm)
pins: 1 K, 2 A

## P6KE7.5A
designator D?
600 W Peak Power Transient Voltage Suppressor, 2-Pin Surmetic(TM) 40, Bulk Box; Manufacturer: On Semiconductor; PartNumber: P6KE7.5A; Direction: Unidirectional; IR Max (uA): 500; PPK Max (W): 600; V(BR) Typ (V): 7.51; DatasheetVersion: Rev. 10; PackageVersion: Rev. O, 09/2005; PackageReference: SURMETIC40-2-017AA-01; PackageDescription: 2-Pin, Axial Lead, Diameter 3.49 mm; Packing: Bulk Box; Mounting Technology: Through Hole; ComponentLink1Description: Manufacturer URL; ComponentLink1URL: http://www.onsemi.com/; ComponentLink2Description: Datasheet; ComponentLink2URL: http://www.onsemi.com/pub_link/Collateral/P6KE6.8A-D.PDF; ComponentLink3Description: Package Specification; ComponentLink3URL: http://www.onsemi.cn/pub_link/Collateral/017AA.PDF
footprint ONSC-SURMETIC40-2-017AA-01 (AXIAL, 2-Leads, Diameter 3.49mm)
pins: 1 K, 2 A

## P6KE7.5ARLG
designator D?
600 W Peak Power Transient Voltage Suppressor, 2-Pin Surmetic(TM) 40, Pb-Free, Tape and Reel; Manufacturer: On Semiconductor; PartNumber: P6KE7.5ARLG; Direction: Unidirectional; IR Max (uA): 500; PPK Max (W): 600; V(BR) Typ (V): 7.51; DatasheetVersion: Rev. 10; PackageVersion: Rev. O, 09/2005; PackageReference: SURMETIC40-2-017AA-01; PackageDescription: 2-Pin, Axial Lead, Diameter 3.49 mm; Supplier 1: Digi-Key; Supplier Part Number 1: P6KE7.5ARLG-ND; Supplier 2: Mouser; Supplier Part Number 2: 863-P6KE7.5ARLG; Packing: Tape and Reel; RoHS: Pb-Free; Mounting Technology: Through Hole; ComponentLink1Description: Manufacturer URL; ComponentLink1URL: http://www.onsemi.com/; ComponentLink2Description: Datasheet; ComponentLink2URL: http://www.onsemi.com/pub_link/Collateral/P6KE6.8A-D.PDF; ComponentLink3Description: Package Specification; ComponentLink3URL: http://www.onsemi.cn/pub_link/Collateral/017AA.PDF
footprint ONSC-SURMETIC40-2-017AA-01 (AXIAL, 2-Leads, Diameter 3.49mm)
pins: 1 K, 2 A

## P6KE10AG
designator D?
600 W Peak Power Transient Voltage Suppressor, 2-Pin Surmetic(TM) 40, Pb-Free, Bulk Box; Manufacturer: On Semiconductor; PartNumber: P6KE10AG; Direction: Unidirectional; IR Max (uA): 10; PPK Max (W): 600; DatasheetVersion: Rev. 10; PackageVersion: Rev. O, 09/2005; PackageReference: SURMETIC40-2-017AA-01; PackageDescription: 2-Pin, Axial Lead, Diameter 3.49 mm; Supplier 1: Digi-Key; Supplier Part Number 1: P6KE10AGOS-ND; Supplier 2: Newark; Supplier Part Number 2: 42K2506; Supplier 3: Mouser; Supplier Part Number 3: 863-P6KE10AG; Packing: Bulk Box; RoHS: Pb-Free; V(BR) Typ (V): 10; Mounting Technology: Through Hole; ComponentLink1Description: Manufacturer URL; ComponentLink1URL: http://www.onsemi.com/; ComponentLink2Description: Datasheet; ComponentLink2URL: http://www.onsemi.com/pub_link/Collateral/P6KE6.8A-D.PDF; ComponentLink3Description: Package Specification; ComponentLink3URL: http://www.onsemi.cn/pub_link/Collateral/017AA.PDF
footprint ONSC-SURMETIC40-2-017AA-01 (AXIAL, 2-Leads, Diameter 3.49mm)
pins: 1 K, 2 A

## P6KE10ARLG
designator D?
600 W Peak Power Transient Voltage Suppressor, 2-Pin Surmetic(TM) 40, Pb-Free, Tape and Reel; Manufacturer: On Semiconductor; PartNumber: P6KE10ARLG; Direction: Unidirectional; IR Max (uA): 10; PPK Max (W): 600; DatasheetVersion: Rev. 10; PackageVersion: Rev. O, 09/2005; PackageReference: SURMETIC40-2-017AA-01; PackageDescription: 2-Pin, Axial Lead, Diameter 3.49 mm; Supplier 1: Digi-Key; Supplier Part Number 1: P6KE10ARLG-ND; Supplier 2: Newark; Supplier Part Number 2: 42K2507; Supplier 3: Mouser; Supplier Part Number 3: 863-P6KE10ARLG; Packing: Tape and Reel; RoHS: Pb-Free; V(BR) Typ (V): 10; Mounting Technology: Through Hole; ComponentLink1Description: Manufacturer URL; ComponentLink1URL: http://www.onsemi.com/; ComponentLink2Description: Datasheet; ComponentLink2URL: http://www.onsemi.com/pub_link/Collateral/P6KE6.8A-D.PDF; ComponentLink3Description: Package Specification; ComponentLink3URL: http://www.onsemi.cn/pub_link/Collateral/017AA.PDF
footprint ONSC-SURMETIC40-2-017AA-01 (AXIAL, 2-Leads, Diameter 3.49mm)
pins: 1 K, 2 A

## P6KE12A
designator D?
600 W Peak Power Transient Voltage Suppressor, 2-Pin Surmetic(TM) 40, Bulk Box; Manufacturer: On Semiconductor; PartNumber: P6KE12A; Direction: Unidirectional; IR Max (uA): 5; PPK Max (W): 600; V(BR) Typ (V): 12; DatasheetVersion: Rev. 10; PackageVersion: Rev. O, 09/2005; PackageReference: SURMETIC40-2-017AA-01; PackageDescription: 2-Pin, Axial Lead, Diameter 3.49 mm; Packing: Bulk Box; Mounting Technology: Through Hole; ComponentLink1Description: Manufacturer URL; ComponentLink1URL: http://www.onsemi.com/; ComponentLink2Description: Datasheet; ComponentLink2URL: http://www.onsemi.com/pub_link/Collateral/P6KE6.8A-D.PDF; ComponentLink3Description: Package Specification; ComponentLink3URL: http://www.onsemi.cn/pub_link/Collateral/017AA.PDF
footprint ONSC-SURMETIC40-2-017AA-01 (AXIAL, 2-Leads, Diameter 3.49mm)
pins: 1 K, 2 A

## P6KE12AG
designator D?
600 W Peak Power Transient Voltage Suppressor, 2-Pin Surmetic(TM) 40, Pb-Free, Bulk Box; Manufacturer: On Semiconductor; PartNumber: P6KE12AG; Direction: Unidirectional; IR Max (uA): 5; PPK Max (W): 600; V(BR) Typ (V): 12; DatasheetVersion: Rev. 10; PackageVersion: Rev. O, 09/2005; PackageReference: SURMETIC40-2-017AA-01; PackageDescription: 2-Pin, Axial Lead, Diameter 3.49 mm; Supplier 1: Digi-Key; Supplier Part Number 1: P6KE12AGOS-ND; Supplier 2: Newark; Supplier Part Number 2: 42K2512; Supplier 3: Mouser; Supplier Part Number 3: 863-P6KE12AG; Packing: Bulk Box; RoHS: Pb-Free; Mounting Technology: Through Hole; ComponentLink1Description: Manufacturer URL; ComponentLink1URL: http://www.onsemi.com/; ComponentLink2Description: Datasheet; ComponentLink2URL: http://www.onsemi.com/pub_link/Collateral/P6KE6.8A-D.PDF; ComponentLink3Description: Package Specification; ComponentLink3URL: http://www.onsemi.cn/pub_link/Collateral/017AA.PDF
footprint ONSC-SURMETIC40-2-017AA-01 (AXIAL, 2-Leads, Diameter 3.49mm)
pins: 1 K, 2 A

## P6KE12ARLG
designator D?
600 W Peak Power Transient Voltage Suppressor, 2-Pin Surmetic(TM) 40, Pb-Free, Tape and Reel; Manufacturer: On Semiconductor; PartNumber: P6KE12ARLG; Direction: Unidirectional; IR Max (uA): 5; PPK Max (W): 600; V(BR) Typ (V): 12; DatasheetVersion: Rev. 10; PackageVersion: Rev. O, 09/2005; PackageReference: SURMETIC40-2-017AA-01; PackageDescription: 2-Pin, Axial Lead, Diameter 3.49 mm; Supplier 1: Digi-Key; Supplier Part Number 1: P6KE12ARLG-ND; Supplier 2: Mouser; Supplier Part Number 2: 863-P6KE12ARLG; Packing: Tape and Reel; RoHS: Pb-Free; Mounting Technology: Through Hole; ComponentLink1Description: Manufacturer URL; ComponentLink1URL: http://www.onsemi.com/; ComponentLink2Description: Datasheet; ComponentLink2URL: http://www.onsemi.com/pub_link/Collateral/P6KE6.8A-D.PDF; ComponentLink3Description: Package Specification; ComponentLink3URL: http://www.onsemi.cn/pub_link/Collateral/017AA.PDF
footprint ONSC-SURMETIC40-2-017AA-01 (AXIAL, 2-Leads, Diameter 3.49mm)
pins: 1 K, 2 A

## P6KE13AG
designator D?
600 W Peak Power Transient Voltage Suppressor, 2-Pin Surmetic(TM) 40, Pb-Free, Bulk Box; Manufacturer: On Semiconductor; PartNumber: P6KE13AG; Direction: Unidirectional; IR Max (uA): 5; PPK Max (W): 600; V(BR) Typ (V): 13.05; DatasheetVersion: Rev. 10; PackageVersion: Rev. O, 09/2005; PackageReference: SURMETIC40-2-017AA-01; PackageDescription: 2-Pin, Axial Lead, Diameter 3.49 mm; Supplier 1: Digi-Key; Supplier Part Number 1: P6KE13AG-ND; Supplier 2: Mouser; Supplier Part Number 2: 863-P6KE13AG; Packing: Bulk Box; RoHS: Pb-Free; Mounting Technology: Through Hole; ComponentLink1Description: Manufacturer URL; ComponentLink1URL: http://www.onsemi.com/; ComponentLink2Description: Datasheet; ComponentLink2URL: http://www.onsemi.com/pub_link/Collateral/P6KE6.8A-D.PDF; ComponentLink3Description: Package Specification; ComponentLink3URL: http://www.onsemi.cn/pub_link/Collateral/017AA.PDF
footprint ONSC-SURMETIC40-2-017AA-01 (AXIAL, 2-Leads, Diameter 3.49mm)
pins: 1 K, 2 A
